# Altium footprint library MyPcbLib.PcbLib: 222 footprints (part 9 of 14)
Each footprint in its own frame and in the unit in brackets; x right, y up, seen from the top. Pads: shape width x height; smd on the part's side, far side on the other; paste and mask are expansions set on the pad; w line width, h text height; cw(c..) or ccw(c..) is an arc to the next point about the centre after c.
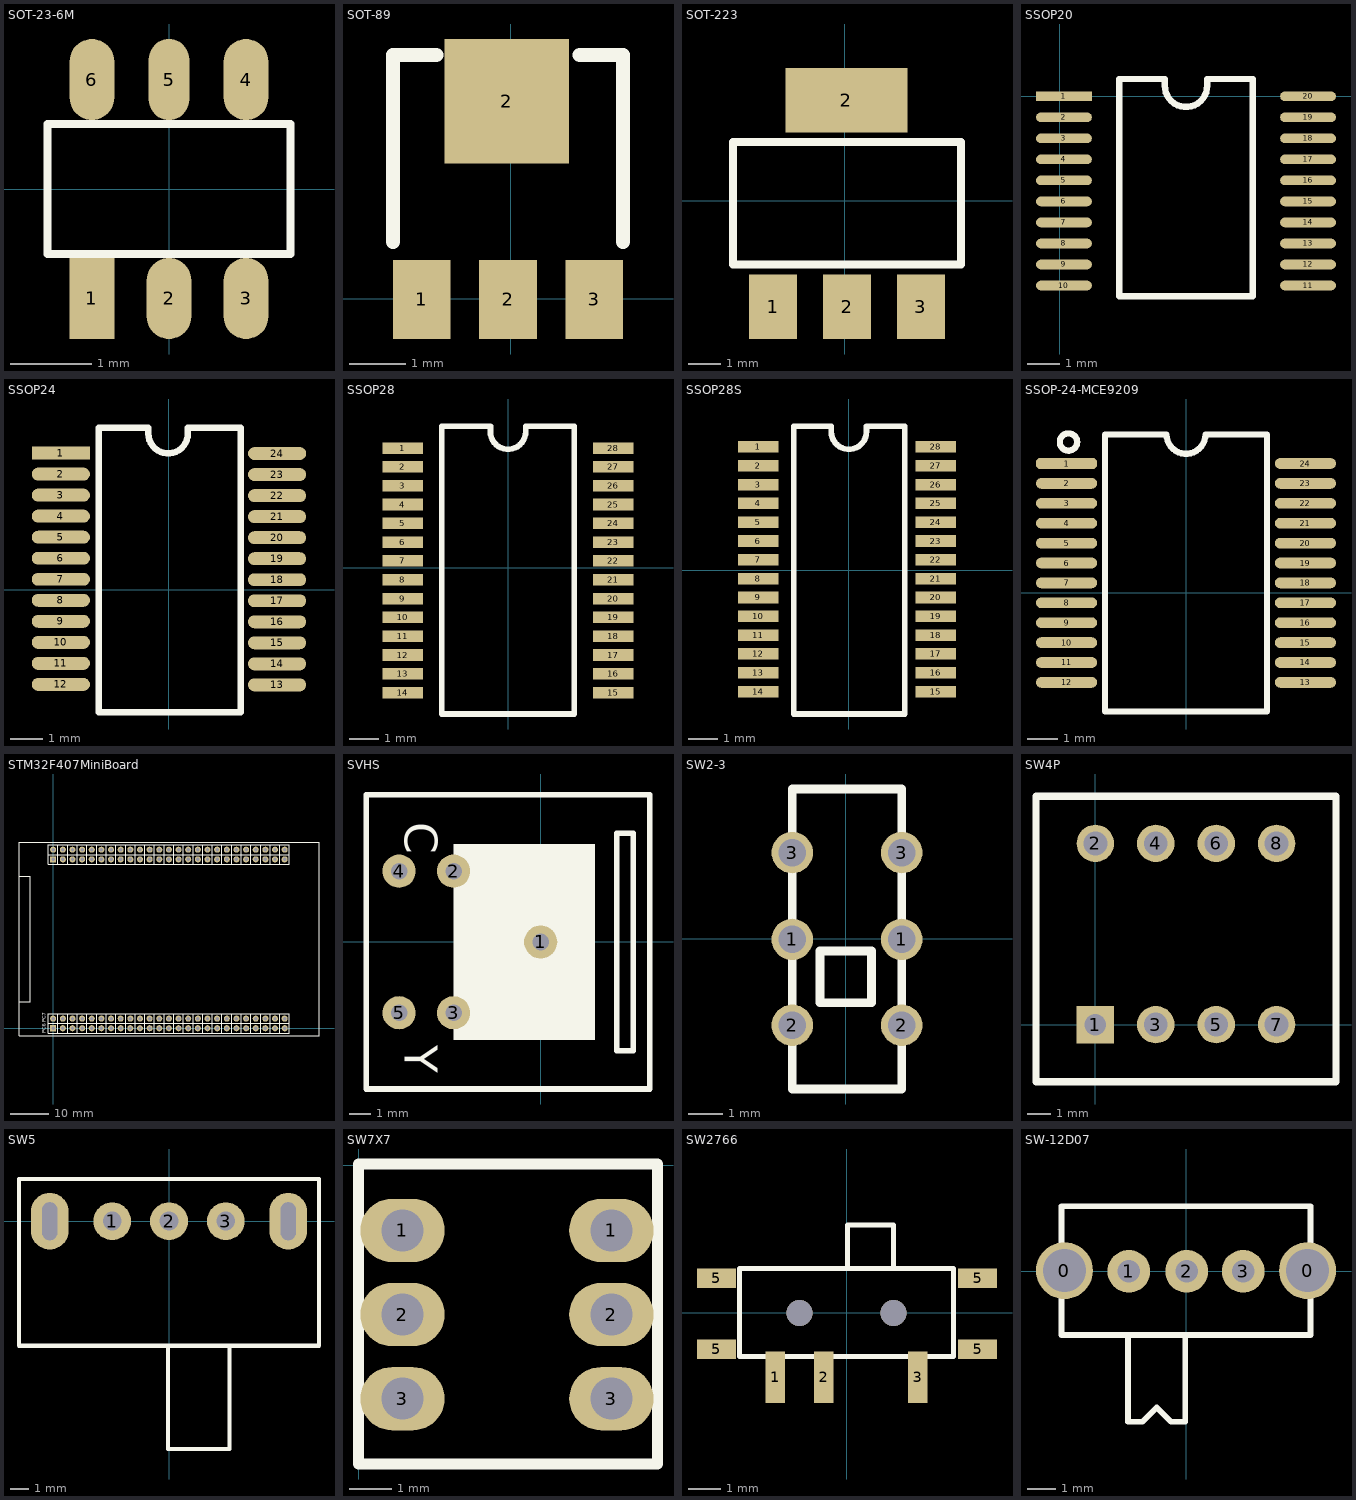
[diagram p8: the footprints below, top view; thin cyan lines are the x and y axes]

## SOT-23-6M [mm]
pads (6):
  rect 0.55x1 smd: 1(-0.95,-1.35)
  oval 0.55x1 smd: 2(0,-1.35) 3(0.95,-1.35) 4(0.95,1.35) 6(-0.95,1.35)
  oval 0.5x1 smd: 5(0,1.35)
Top Overlay:
  lines w0.1: -1.5,-0.8 -1.5,0.8 1.5,0.8 1.5,-0.8 -1.5,-0.8
3D body "SOT-23-6-3.STEP": height 0.86, standoff 0, extent -1.5,-1.405 1.5,1.405

## SOT-89 [mil]
pads (4):
  rect 40x55 smd: 1(-61.82,-0.57) 2(-1.82,-0.57) 3(58.18,-0.57)
  rect 86.61x86.61 smd: 2(-2.76,137.22)
Top Overlay:
  lines w10: -81.82,39.43 -81.82,169.43 -51.82,169.43 ; 48.18,169.43 78.18,169.43 78.18,39.43
3D body "SOT-89.STEP": height 59.45, standoff 0, extent -90.07,-6.45 87.1,162.85

## SOT-223 [mil]
pads (4):
  rect 59x79 smd: 1(-88,-130) 2(2.55,-130) 3(93.1,-130)
  rect 150x79 smd: 2(1.88,123.54)
Top Overlay:
  lines w10: -137.45,-78 -137.45,72 142.55,72 142.55,-78 -137.45,-78
3D body "SOT-223_MP04A.STEP": height 66.93, standoff 0, extent -126.41,-138.72 129.5,135.3

## SSOP20 [mm]
pads (20):
  rect 1.727x0.3 smd: 1(0.127,0)
  oval 1.727x0.3 smd: 2(0.127,-0.65) 3(0.127,-1.3) 4(0.127,-1.95) 5(0.127,-2.6) 6(0.127,-3.25) 7(0.127,-3.9) 8(0.127,-4.55) 9(0.127,-5.2) 10(0.127,-5.85) 11(7.673,-5.85) 12(7.673,-5.2) 13(7.673,-4.55) 14(7.673,-3.9) 15(7.673,-3.25) 16(7.673,-2.6) 17(7.673,-1.95) 18(7.673,-1.3) 19(7.673,-0.65) 20(7.673,0)
Top Overlay:
  lines w0.2: 1.835,-6.175 5.965,-6.175 5.965,0.533 4.555,0.533 4.555,0.325 cw(c3.9,0.325) 3.245,0.325 3.245,0.533 1.835,0.533 1.835,-6.175
3D body "SSOP-20.STEP": height 1.79, standoff -0.05, extent -0.013,-6.52 7.887,0.78

## SSOP24 [mm]
pads (24):
  rect 1.8x0.4 smd: 1(-3.326,4.229)
  oval 1.8x0.4 smd: 2(-3.326,3.579) 3(-3.326,2.93) 4(-3.326,2.28) 5(-3.326,1.63) 6(-3.326,0.981) 7(-3.326,0.331) 8(-3.326,-0.319) 9(-3.326,-0.968) 10(-3.326,-1.618) 11(-3.326,-2.267) 12(-3.326,-2.917) 13(3.353,-2.932) 14(3.353,-2.282) 15(3.353,-1.632) 16(3.353,-0.983) 17(3.353,-0.333) 18(3.353,0.316) 19(3.353,0.966) 20(3.353,1.616) 21(3.353,2.265) 22(3.353,2.915) 23(3.353,3.565) 24(3.354,4.214)
Top Overlay:
  lines w0.2: -2.159,-3.785 2.235,-3.785 2.235,5.01 0.597,5.01 0.597,4.827 cw(c-0.013,4.827) -0.622,4.827 -0.622,5.01 -2.159,5.01 -2.159,-3.785
3D body "SSOP 24 PIN_.step": height 1.78, standoff -0.21, extent -3.924,-3.654 3.976,4.976

## SSOP28 [mil]
height 93.7
pads (28):
  rect 55x15.75 smd: 1(-142.95,162.5) 2(-142.95,136.92) 3(-142.95,111.34) 4(-142.95,85.77) 5(-142.95,60.19) 6(-142.95,34.61) 7(-142.95,9.04) 8(-142.95,-16.54) 9(-142.95,-42.12) 10(-142.95,-67.69) 11(-142.95,-93.27) 12(-142.95,-118.85) 13(-142.95,-144.42) 14(-143,-170) 15(142.95,-170) 16(142.95,-144.42) 17(142.95,-118.85) 18(142.95,-93.27) 19(142.95,-67.69) 20(142.95,-42.12) 21(142.95,-16.54) 22(142.95,9.04) 23(142.95,34.62) 24(142.95,60.19) 25(142.95,85.77) 26(142.95,111.35) 27(142.95,136.92) 28(142.95,162.5)
Top Overlay:
  lines w7.87: -90,-199 90,-199 90,192 23.99,192 23.99,184.8 cw(c0,184.8) -23.99,184.8 -23.99,192 -90,192 -90,-199
3D body "TSSOP28.STEP": height 41.34, standoff 0, extent -133.91,-196.91 125.93,188.92

## SSOP28S [mil]
pads (28):
  rect 55x15.75 smd: 1(-122.95,167.5) 2(-122.95,141.92) 3(-122.95,116.34) 4(-122.95,90.77) 5(-122.95,65.19) 6(-122.95,39.61) 7(-122.95,14.04) 8(-122.95,-11.54) 9(-122.95,-37.12) 10(-122.95,-62.69) 11(-122.95,-88.27) 12(-122.95,-113.85) 13(-122.95,-139.42) 14(-123,-165) 15(117.95,-165) 16(117.95,-139.42) 17(117.95,-113.85) 18(117.95,-88.27) 19(117.95,-62.69) 20(117.95,-37.12) 21(117.95,-11.54) 22(117.95,14.04) 23(117.95,39.62) 24(117.95,65.19) 25(117.95,90.77) 26(117.95,116.35) 27(117.95,141.92) 28(117.95,167.5)
Top Overlay:
  lines w7.87: -75,-195.5 76,-195.5 76,195.5 23.99,195.5 23.99,188.3 cw(c0,188.3) -23.99,188.3 -23.99,195.5 -75,195.5 -75,-195.5
3D body "TSSOP28.STEP": height 41.34, standoff 0, extent -128.87,-192.5 130.97,193.32

## SSOP-24-MCE9209 [mm]
pads (24):
  oct 2x0.35 smd: 1(-3.9,4.225)
  oval 2x0.35 smd: 2(-3.9,3.575) 3(-3.9,2.925) 4(-3.9,2.275) 5(-3.9,1.625) 6(-3.9,0.975) 7(-3.9,0.325) 8(-3.9,-0.325) 9(-3.9,-0.975) 10(-3.9,-1.625) 11(-3.9,-2.275) 12(-3.9,-2.925) 13(3.9,-2.925) 14(3.9,-2.275) 15(3.9,-1.625) 16(3.9,-0.975) 17(3.9,-0.325) 18(3.9,0.325) 19(3.9,0.975) 20(3.9,1.625) 21(3.9,2.275) 22(3.9,2.925) 23(3.9,3.575) 24(3.9,4.225)
Top Overlay:
  circle w0.203: c-3.839,4.928 r0.283
  lines w0.203: -2.65,-3.875 2.65,-3.875 2.65,5.175 0.635,5.175 cw(c0,5.175) -0.635,5.175 -2.65,5.175 -2.65,-3.875
3D body "SSOP-24-MCE9209.STEP": height 1.54, standoff 0, extent -4.135,-3.574 3.881,4.826

## STM32F407MiniBoard [mm]
pads (100):
  rect 1.6x1.6 hole 0.9: 1(0,0) 51(0,44.475)
  round 1.6 hole 0.9: 2(0,2.54) 3(2.54,0) 4(2.54,2.54) 5(5.08,0) 6(5.08,2.54) 7(7.62,0) 8(7.62,2.54) 9(10.16,0) 10(10.16,2.54) 11(12.7,0) 12(12.7,2.54) 13(15.24,0) 14(15.24,2.54) 15(17.78,0) 16(17.78,2.54) 17(20.32,0) 18(20.32,2.54) 19(22.86,0) 20(22.86,2.54) 21(25.4,0) 22(25.4,2.54) 23(27.94,0) 24(27.94,2.54) 25(30.48,0) 26(30.48,2.54) 27(33.02,0) 28(33.02,2.54) 29(35.56,0) 30(35.56,2.54) 31(38.1,0) 32(38.1,2.54) 33(40.64,0) 34(40.64,2.54) 35(43.18,0) 36(43.18,2.54) 37(45.72,0) 38(45.72,2.54) 39(48.26,0) 40(48.26,2.54) 41(50.8,0) 42(50.8,2.54) 43(53.34,0) 44(53.34,2.54) 45(55.88,0) 46(55.88,2.54) 47(58.42,0) 48(58.42,2.54) 49(60.96,0) 50(60.96,2.54) 52(2.54,44.475) 53(5.08,44.475) 54(7.62,44.475) 55(10.16,44.475) 56(12.7,44.475) 57(15.24,44.475) 58(17.78,44.475) 59(20.32,44.475) 60(22.86,44.475) 61(25.4,44.475) 62(27.94,44.475) 63(30.48,44.475) 64(33.02,44.475) 65(35.56,44.475) 66(38.1,44.475) 67(40.64,44.475) 68(43.18,44.475) 69(45.72,44.475) 70(48.26,44.475) 71(50.8,44.475) 72(53.34,44.475) 73(55.88,44.475) 74(58.42,44.475) 75(60.96,44.475) 76(60.96,47.015) 77(58.42,47.015) 78(55.88,47.015) 79(53.34,47.015) 80(50.8,47.015) 81(48.26,47.015) 82(45.72,47.015) 83(43.18,47.015) 84(40.64,47.015) 85(38.1,47.015) 86(35.56,47.015) 87(33.02,47.015) 88(30.48,47.015) 89(27.94,47.015) 90(25.4,47.015) 91(22.86,47.015) 92(20.32,47.015) 93(17.78,47.015) 94(15.24,47.015) 95(12.7,47.015) 96(10.16,47.015) 97(7.62,47.015) 98(5.08,47.015) 99(2.54,47.015) 100(0,47.015)
Top Overlay:
  lines w0.2: 62.23,-1.27 -1.27,-1.27 -1.27,3.81 62.23,3.81 ; 62.23,43.205 -1.27,43.205 -1.27,48.285 62.23,48.285
  lines w0.203: -1.27,1.27 62.23,1.27 ; -1.27,45.745 62.23,45.745 ; 1.27,-1.27 1.27,3.81 ; 1.27,43.205 1.27,48.285 ; 3.81,-1.27 3.81,3.81 ; 3.81,43.205 3.81,48.285 ; 6.35,-1.27 6.35,3.81 ; 6.35,43.205 6.35,48.285 ; 8.89,-1.27 8.89,3.81 ; 8.89,43.205 8.89,48.285 ; 11.43,-1.27 11.43,3.81 ; 11.43,43.205 11.43,48.285 ; 13.97,-1.27 13.97,3.81 ; 13.97,43.205 13.97,48.285 ; 16.51,-1.27 16.51,3.81 ; 16.51,43.205 16.51,48.285 ; 19.05,-1.27 19.05,3.81 ; 19.05,43.205 19.05,48.285 ; 21.59,-1.27 21.59,3.81 ; 21.59,43.205 21.59,48.285 ; 24.13,-1.27 24.13,3.81 ; 24.13,43.205 24.13,48.285 ; 26.67,-1.27 26.67,3.81 ; 26.67,43.205 26.67,48.285 ; 29.21,-1.27 29.21,3.81 ; 29.21,43.205 29.21,48.285 ; 31.75,-1.27 31.75,3.81 ; 31.75,43.205 31.75,48.285 ; 34.29,-1.27 34.29,3.81 ; 34.29,43.205 34.29,48.285 ; 36.83,-1.27 36.83,3.81 ; 36.83,43.205 36.83,48.285 ; 39.37,-1.27 39.37,3.81 ; 39.37,43.205 39.37,48.285 ; 41.91,-1.27 41.91,3.81 ; 41.91,43.205 41.91,48.285 ; 44.45,-1.27 44.45,3.81 ; 44.45,43.205 44.45,48.285 ; 46.99,-1.27 46.99,3.81 ; 46.99,43.205 46.99,48.285 ; 49.53,-1.27 49.53,3.81 ; 49.53,43.205 49.53,48.285 ; 52.07,-1.27 52.07,3.81 ; 52.07,43.205 52.07,48.285 ; 54.61,-1.27 54.61,3.81 ; 54.61,43.205 54.61,48.285 ; 57.15,-1.27 57.15,3.81 ; 57.15,43.205 57.15,48.285 ; 59.69,-1.27 59.69,3.81 ; 59.69,43.205 59.69,48.285 ; 62.23,-1.27 62.23,3.81 ; 62.23,43.205 62.23,48.285
  lines w0.254: -9,7 -8,7 -6,7 -6,40 -9,40 ; -9,-2 -1.27,-2 70,-2 70,49 62.23,49 -9,49 -9,48.285 -9,-2
  text "PC6 PC7" at -2,-1.27 h1
3D body "HDR2.54-1x2P.STEP": height 8.5, standoff -3, extent 57.15,43.205 59.69,48.285
3D body "HDR2.54-1x2P.STEP": height 8.5, standoff -3, extent 49.53,43.205 52.07,48.285
3D body "HDR2.54-1x2P.STEP": height 8.5, standoff -3, extent 54.61,43.205 57.15,48.285
3D body "HDR2.54-1x2P.STEP": height 8.5, standoff -3, extent 52.07,43.205 54.61,48.285
3D body "HDR2.54-1x2P.STEP": height 8.5, standoff -3, extent 59.69,43.205 62.23,48.285
3D body "HDR2.54-1x2P.STEP": height 8.5, standoff -3, extent 41.91,43.205 44.45,48.285
3D body "HDR2.54-1x2P.STEP": height 8.5, standoff -3, extent 44.45,43.205 46.99,48.285
3D body "HDR2.54-1x2P.STEP": height 8.5, standoff -3, extent 36.83,43.205 39.37,48.285
3D body "HDR2.54-1x2P.STEP": height 8.5, standoff -3, extent 39.37,43.205 41.91,48.285
3D body "HDR2.54-1x2P.STEP": height 8.5, standoff -3, extent 46.99,43.205 49.53,48.285
3D body "HDR2.54-1x2P.STEP": height 8.5, standoff -3, extent 29.21,43.205 31.75,48.285
3D body "HDR2.54-1x2P.STEP": height 8.5, standoff -3, extent 31.75,43.205 34.29,48.285
3D body "HDR2.54-1x2P.STEP": height 8.5, standoff -3, extent 24.13,43.205 26.67,48.285
3D body "HDR2.54-1x2P.STEP": height 8.5, standoff -3, extent 26.67,43.205 29.21,48.285
3D body "HDR2.54-1x2P.STEP": height 8.5, standoff -3, extent 34.29,43.205 36.83,48.285
3D body "HDR2.54-1x2P.STEP": height 8.5, standoff -3, extent 16.51,43.205 19.05,48.285
3D body "HDR2.54-1x2P.STEP": height 8.5, standoff -3, extent 19.05,43.205 21.59,48.285
3D body "HDR2.54-1x2P.STEP": height 8.5, standoff -3, extent 11.43,43.205 13.97,48.285
3D body "HDR2.54-1x2P.STEP": height 8.5, standoff -3, extent 13.97,43.205 16.51,48.285
3D body "HDR2.54-1x2P.STEP": height 8.5, standoff -3, extent 21.59,43.205 24.13,48.285
3D body "HDR2.54-1x2P.STEP": height 8.5, standoff -3, extent 3.81,43.205 6.35,48.285
3D body "HDR2.54-1x2P.STEP": height 8.5, standoff -3, extent 6.35,43.205 8.89,48.285
3D body "HDR2.54-1x2P.STEP": height 8.5, standoff -3, extent -1.27,43.205 1.27,48.285
3D body "HDR2.54-1x2P.STEP": height 8.5, standoff -3, extent 1.27,43.205 3.81,48.285
3D body "HDR2.54-1x2P.STEP": height 8.5, standoff -3, extent 8.89,43.205 11.43,48.285
3D body "HDR2.54-1x2P.STEP": height 8.5, standoff -3, extent 8.89,-1.27 11.43,3.81
3D body "HDR2.54-1x2P.STEP": height 8.5, standoff -3, extent 1.27,-1.27 3.81,3.81
3D body "HDR2.54-1x2P.STEP": height 8.5, standoff -3, extent -1.27,-1.27 1.27,3.81
3D body "HDR2.54-1x2P.STEP": height 8.5, standoff -3, extent 6.35,-1.27 8.89,3.81
3D body "HDR2.54-1x2P.STEP": height 8.5, standoff -3, extent 3.81,-1.27 6.35,3.81
3D body "HDR2.54-1x2P.STEP": height 8.5, standoff -3, extent 21.59,-1.27 24.13,3.81
3D body "HDR2.54-1x2P.STEP": height 8.5, standoff -3, extent 13.97,-1.27 16.51,3.81
3D body "HDR2.54-1x2P.STEP": height 8.5, standoff -3, extent 11.43,-1.27 13.97,3.81
3D body "HDR2.54-1x2P.STEP": height 8.5, standoff -3, extent 19.05,-1.27 21.59,3.81
3D body "HDR2.54-1x2P.STEP": height 8.5, standoff -3, extent 16.51,-1.27 19.05,3.81
3D body "HDR2.54-1x2P.STEP": height 8.5, standoff -3, extent 34.29,-1.27 36.83,3.81
3D body "HDR2.54-1x2P.STEP": height 8.5, standoff -3, extent 26.67,-1.27 29.21,3.81
3D body "HDR2.54-1x2P.STEP": height 8.5, standoff -3, extent 24.13,-1.27 26.67,3.81
3D body "HDR2.54-1x2P.STEP": height 8.5, standoff -3, extent 31.75,-1.27 34.29,3.81
3D body "HDR2.54-1x2P.STEP": height 8.5, standoff -3, extent 29.21,-1.27 31.75,3.81
3D body "HDR2.54-1x2P.STEP": height 8.5, standoff -3, extent 46.99,-1.27 49.53,3.81
3D body "HDR2.54-1x2P.STEP": height 8.5, standoff -3, extent 39.37,-1.27 41.91,3.81
3D body "HDR2.54-1x2P.STEP": height 8.5, standoff -3, extent 36.83,-1.27 39.37,3.81
3D body "HDR2.54-1x2P.STEP": height 8.5, standoff -3, extent 44.45,-1.27 46.99,3.81
3D body "HDR2.54-1x2P.STEP": height 8.5, standoff -3, extent 41.91,-1.27 44.45,3.81
3D body "HDR2.54-1x2P.STEP": height 8.5, standoff -3, extent 59.69,-1.27 62.23,3.81
3D body "HDR2.54-1x2P.STEP": height 8.5, standoff -3, extent 52.07,-1.27 54.61,3.81
3D body "HDR2.54-1x2P.STEP": height 8.5, standoff -3, extent 54.61,-1.27 57.15,3.81
3D body "HDR2.54-1x2P.STEP": height 8.5, standoff -3, extent 49.53,-1.27 52.07,3.81
3D body "HDR2.54-1x2P.STEP": height 8.5, standoff -3, extent 57.15,-1.27 59.69,3.81

## SVHS [mil] "S VIDEO PORT"
pads (5):
  round 60 hole 30: 1(0,0) 2(-157.48,127.95) 3(-157.48,-127.95) 4(-255.91,127.95) 5(-255.91,-127.95)
Top Overlay:
  rectangle: -157.48,-177.17 98.43,177.17
  lines w10: -314.96,-265.75 196.85,-265.75 196.85,265.75 -314.96,265.75 -314.96,-265.75 ; 137.8,-196.85 137.8,196.85 167.32,196.85 167.32,-196.85 137.8,-196.85
  text "C" at -246.06,216.54 h60
  text "Y" at -246.06,-187.01 h60
3D body "SVHS.STEP": height 767.72, standoff -59.06, extent -314.96,-255.9 118.11,255.91

## SW2-3 [mm]
pads (6):
  round 1.2 hole 0.8: 1(-1.549,-0.025) 1(1.626,-0.025) 2(-1.549,-2.515) 2(1.626,-2.515) 3(-1.549,2.489) 3(1.626,2.489)
Top Overlay:
  lines w0.254: -1.549,-4.363 -1.549,4.337 1.626,4.337 1.626,-4.363 -1.549,-4.363 ; -0.748,-1.863 -0.748,-0.363 0.752,-0.363 0.752,-1.863 -0.748,-1.863
3D body "CK_Slide (2).STEP": height 5.5, standoff -2.95, extent -1.749,-4.551 1.851,4.449

## SW4P [mil]
pads (8):
  rect 62x62 hole 35.43: 1(0,0)
  round 62 hole 39.37: 2(0,300) 3(100,0) 4(100,300) 5(200,0) 6(200,300) 7(300,0) 8(300,300)
Top Overlay:
  lines w12: -98.43,-94.49 398.43,-94.49 398.43,377.95 -98.43,377.95 -98.43,-94.49
3D body "SWDIP4.stp": height 409.45, standoff -118.11, extent -81.7,-133.46 379.72,362.6

## SW5 [mm]
pads (5):
  round 2 hole 1: 1(-3,0) 2(0,0) 3(3,0)
  oval 2x3 hole 0.8 slot 2 at 90 deg: ""(-6.3,0) ""(6.3,0)
Top Overlay:
  lines w0.203: -0.051,-6.579 -0.051,-12.04 3.2,-12.04 3.2,-6.579
  lines w0.22: -7.925,-6.579 -7.925,2.235 7.925,2.235 7.925,-6.579 -7.925,-6.579
3D body "bodongkuaiguan.STEP": height 6.25, standoff -2.85, extent -6.489,-12.266 6.511,0.634

## SW7X7 [mm]
pads (6):
  oval 2x1.5 hole 1: 1(1.041,-1.549) 1(5.994,-1.549) 2(1.041,-3.543) 2(5.994,-3.543) 3(1.041,-5.537) 3(5.994,-5.537)
Top Overlay:
  lines w0.254: 0,-7.087 0,0.025 7.087,0.025 7.087,-7.087 0,-7.087
3D body "button with fixation.step": height 13, standoff -4, extent -0.02,-7.087 6.98,-0.087

## SW2766 [mm]
pads (7):
  rect 0.6x1.6 smd: 1(-2.2,-1.981) 2(-0.7,-1.981) 3(2.2,-1.981)
  rect 1.2x0.6 smd: 5(-4.013,-1.118) 5(-4.013,1.067) 5(4.039,-1.118) 5(4.039,1.067)
via -1.45,0 diameter 0.8 hole 0.8
via 1.45,0 diameter 0.8 hole 0.8
Top Overlay:
  lines w0.152: 0.025,1.422 0.025,2.718 1.448,2.718 1.448,1.422 ; -3.302,-1.346 3.302,-1.346 3.302,1.372 -3.302,1.372 -3.302,-1.346
3D body "MiniSwitch.step": height 1.4, standoff -0.5, extent -3.85,-2.255 3.85,2.545

## SW-12D07 [mm] "SK12D07"
pads (5):
  round 2 hole 1.5: 0(-4.267,0.025) 0(4.267,0.025)
  round 1.5 hole 0.8: 1(-2.007,0) 2(0.025,0) 3(2.007,0)
Top Overlay:
  lines w0.203: -4.369,-2.235 4.369,-2.235 4.369,2.286 -4.369,2.286 -4.369,-2.235 ; -2.032,-5.283 -2.032,-5.182 -2.032,-2.235 -0.025,-2.235 -0.025,-5.283 -0.527,-5.283 -1.029,-4.782 -1.53,-5.283 -2.032,-5.283
3D body "User Library-CK_Slide.step": height 5, standoff -2.49, extent -4.318,-6.167 4.293,2.205